# Altium footprint library electronicvn-library1.PcbLib: 350 footprints (part 17 of 22)
Each footprint in its own frame and in the unit in brackets; x right, y up, seen from the top. Pads: shape width x height; smd on the part's side, far side on the other; paste and mask are expansions set on the pad; w line width, h text height; cw(c..) or ccw(c..) is an arc to the next point about the centre after c.
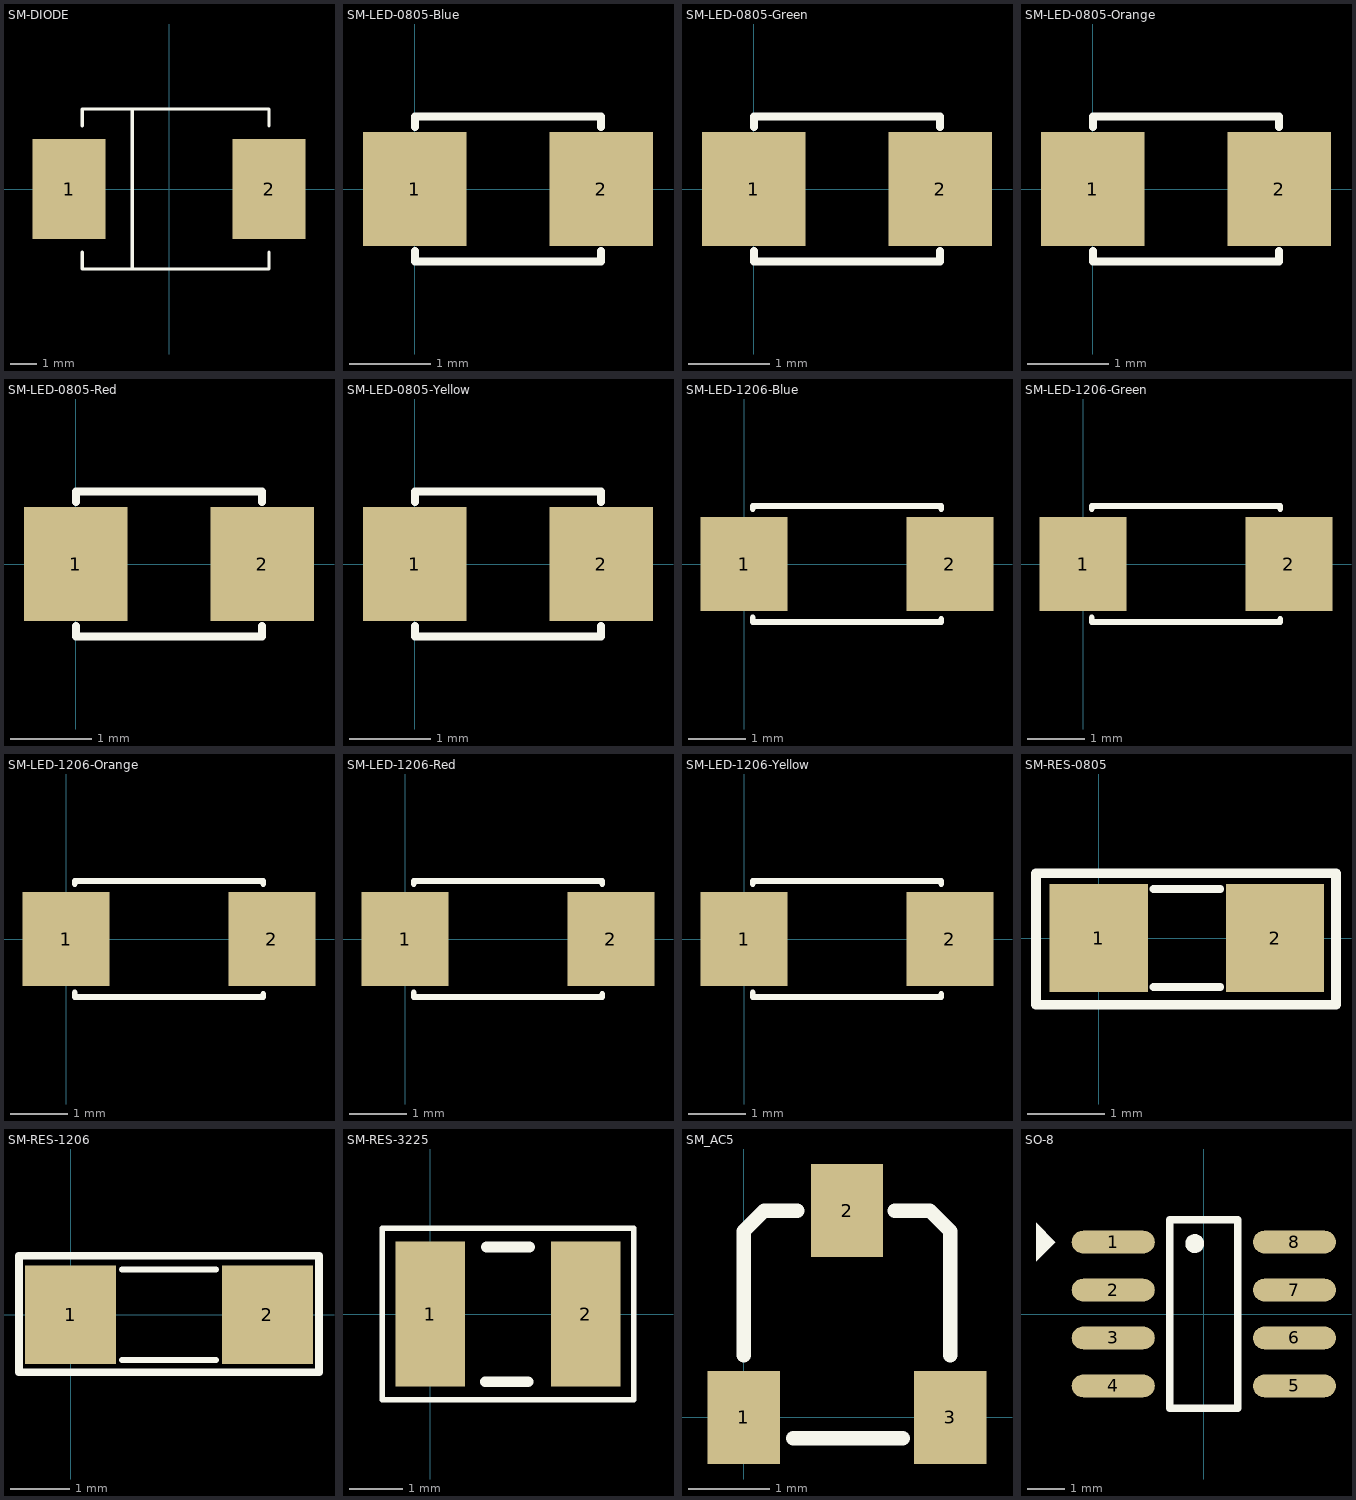
[diagram p16: the footprints below, top view; thin cyan lines are the x and y axes]

## SM-DIODE [mil] "Magnetic-Core Inductor with Winding Polarity Marking; 2 Leads"
pads (2):
  rect 110x150 smd: 1(-150,0) 2(150,0)
Top Overlay:
  lines w5: -130,-95 -130,-120 150,-120 150,-95 ; -130,95 -130,120 150,120 150,95 ; -55,-120 -55,120
Mechanical 1:
  lines w1: -130,-120 150,-120 ; -130,120 150,120
3D body: height 96.27, standoff 0.6, extent -103.33,-72.86 105.33,68.87

## SM-LED-0805-Blue [mil]
pads (2):
  rect 50x55 smd: 1(0,0) 2(90,0)
Top Overlay:
  lines w4: 0,-30 0,-35 90,-35 90,-30 ; 0,30 0,35 90,35 90,30
3D body: height 43.31, standoff 0, extent 5.24,-24.6 84.77,24.61

## SM-LED-0805-Green [mil]
pads (2):
  rect 50x55 smd: 1(0,0) 2(90,0)
Top Overlay:
  lines w4: 0,-30 0,-35 90,-35 90,-30 ; 0,30 0,35 90,35 90,30
3D body: height 43.31, standoff 0, extent 5.24,-24.6 84.77,24.61

## SM-LED-0805-Orange [mil]
pads (2):
  rect 50x55 smd: 1(0,0) 2(90,0)
Top Overlay:
  lines w4: 0,-30 0,-35 90,-35 90,-30 ; 0,30 0,35 90,35 90,30
3D body: height 43.31, standoff 0, extent 5.24,-24.59 84.77,24.62

## SM-LED-0805-Red [mil]
pads (2):
  rect 50x55 smd: 1(0,0) 2(90,0)
Top Overlay:
  lines w4: 0,-30 0,-35 90,-35 90,-30 ; 0,30 0,35 90,35 90,30
3D body: height 43.31, standoff 0, extent 5.25,-24.6 84.77,24.62

## SM-LED-0805-Yellow [mil]
pads (2):
  rect 50x55 smd: 1(0,0) 2(90,0)
Top Overlay:
  lines w4: 0,-30 0,-35 90,-35 90,-30 ; 0,30 0,35 90,35 90,30
3D body: height 43.31, standoff 0, extent 5.25,-24.6 84.77,24.62

## SM-LED-1206-Blue [mil] "Compoment SMD 120x60mil"
height 50
pads (2):
  rect 60x65 smd: 1(0,0) 2(142,0)
Top Overlay:
  lines w4: 6,-37 6,-40 136,-40 136,-38 ; 6,38 6,40 136,40 136,38
3D body: height 43.31, standoff 0, extent 6.62,-31.49 133.39,31.5

## SM-LED-1206-Green [mil]
pads (2):
  rect 60x65 smd: 1(0,0) 2(142,0)
Top Overlay:
  lines w4: 6,-37 6,-40 136,-40 136,-38 ; 6,38 6,40 136,40 136,38
3D body: height 43.31, standoff 0, extent 6.62,-31.49 133.39,31.5

## SM-LED-1206-Orange [mil]
pads (2):
  rect 60x65 smd: 1(0,0) 2(142,0)
Top Overlay:
  lines w4: 6,-37 6,-40 136,-40 136,-38 ; 6,38 6,40 136,40 136,38
3D body: height 43.31, standoff 0, extent 6.62,-31.49 133.39,31.5

## SM-LED-1206-Red [mil]
pads (2):
  rect 60x65 smd: 1(0,0) 2(142,0)
Top Overlay:
  lines w4: 6,-37 6,-40 136,-40 136,-38 ; 6,38 6,40 136,40 136,38
3D body: height 43.31, standoff 0, extent 6.62,-31.49 133.39,31.5

## SM-LED-1206-Yellow [mil]
pads (2):
  rect 60x65 smd: 1(0,0) 2(142,0)
Top Overlay:
  lines w4: 6,-37 6,-40 136,-40 136,-38 ; 6,38 6,40 136,40 136,38
3D body: height 43.31, standoff 0, extent 6.62,-31.49 133.39,31.5

## SM-RES-0805 [mil]
pads (2):
  rect 50x55 smd: 1(0,0) 2(90,0)
Top Overlay:
  lines w4: 28,-25 62,-25 ; 28,25 62,25
  lines w5: -32,-34 121,-34 121,33 -32,33 -32,-34
3D body: height 31.39, standoff 0.6, extent 5.64,-24.6 84.38,24.61

## SM-RES-1206 [mil]
pads (2):
  rect 60x65 smd: 1(0,0) 2(130,0)
Top Overlay:
  lines w4: 34,-30 96,-30 ; 34,30 96,30
  lines w5: -34,-38 -34,39 164,39 164,-38 -34,-38
3D body: height 40.05, standoff 0.6, extent 2.01,-31.49 128,31.5

## SM-RES-3225 [mm] "Chip Capacitor, Body 3.2x2.5mm, IPC Medium Density"
height 1.35
pads (2):
  rect 1.3x2.7 smd: 1(0,0) 2(2.9,0)
Top Overlay:
  lines w0.1: -0.9,-1.6 3.8,-1.6 3.8,1.6 -0.9,1.6 -0.9,-1.6
  lines w0.2: 1.025,-1.265 1.825,-1.265 ; 1.05,1.25 1.85,1.25
3D body: height 0.55, standoff 0, extent -0.127,-1.25 3.073,1.25

## SM_AC5 [mil]
pads (3):
  rect 35x45 smd: 1(0,0) 2(50,100) 3(100,0)
Top Overlay:
  lines w7: 0,30 0,90 10,100 26,100 ; 24,-10 77,-10 ; 73,100 90,100 100,90 100,30

## SO-8 [mm] "8-Pin Small Outline Integrated Circuit 1.27 mm Pitch, IPC Medium Density"
height 1.75
pads (8):
  oval 2.2x0.6 smd: 1(-2.4,1.905) 2(-2.4,0.635) 3(-2.4,-0.635) 4(-2.4,-1.905) 5(2.4,-1.905) 6(2.4,-0.635) 7(2.4,0.635) 8(2.4,1.905)
Top Overlay:
  circle w0.25: c-0.241,1.866 r0.125
  region: -4.445,1.397 -3.937,1.905 -4.445,2.413
  lines w0.2: -0.9,-2.5 0.9,-2.5 0.9,2.5 -0.9,2.5 -0.9,-2.5
3D body: height 1.75, standoff 0, extent -2.93,-2.511 3.082,2.489